# Altium schematic symbol library jlcpcb_2025_04_resistors_extended_1210.schlib: 2670 symbols (part 3 of 14)
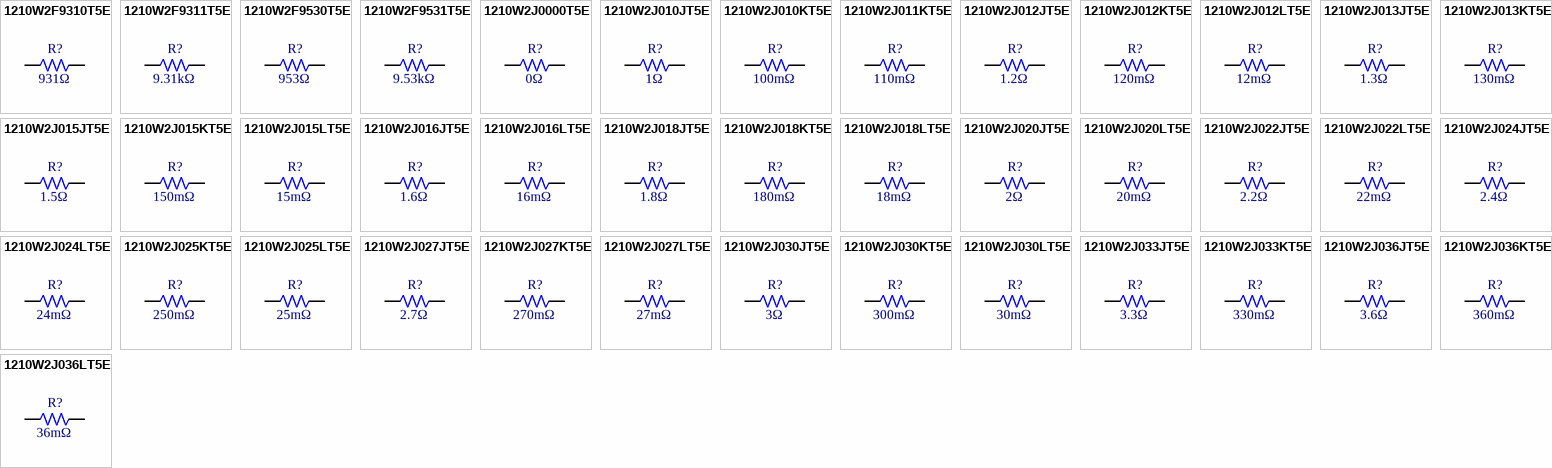
[diagram p68: symbols 1210W2F9310T5E to 1210W2J036LT5E]

## 1210W2J025LT5E
designator R?  Resistance: 25mΩ  (hidden comment: *)
Resistor, 25mΩ, ±5%, 500mW, 200V, ±800ppm/℃, -55℃~+155℃, SMD 1210; Manufacturer: Uniroyal; Manufacturer Part Number: 1210W2J025LT5E; Supplier 1: LCSC; Supplier Part Number 1: C620974; JLCPCB Part Number: C620974; Power Rating: 500mW; Category: Resistors; Package Size: 1210; JLCPCB Basic Part: Yes; Tolerance: ±5%; Voltage Rating: 200V; Temperature Coefficient: ±800ppm/℃; Temperature Rating: -55℃~+155℃; ComponentLink1Description: Datasheet; ComponentLink1URL: https://wmsc.lcsc.com/wmsc/upload/file/pdf/v2/lcsc/2205311816_UNI-ROYAL-Uniroyal-Elec-1210W2J025LT5E_C620974.pdf; ComponentLink2Description: JLCPCB Part URL; ComponentLink2URL: https://jlcpcb.com/partdetail/C620974
pins: 1, 2
1 alternate drawing of the same symbol

## 1210W2J027JT5E
designator R?  Resistance: 2.7Ω  (hidden comment: *)
Resistor, 2.7Ω, ±5%, 500mW, 200V, ±400ppm/℃, -55℃~+155℃, SMD 1210; Manufacturer: Uniroyal; Manufacturer Part Number: 1210W2J027JT5E; Supplier 1: LCSC; Supplier Part Number 1: C621014; JLCPCB Part Number: C621014; Power Rating: 500mW; Category: Resistors; Package Size: 1210; JLCPCB Basic Part: Yes; Tolerance: ±5%; Voltage Rating: 200V; Temperature Coefficient: ±400ppm/℃; Temperature Rating: -55℃~+155℃; ComponentLink1Description: Datasheet; ComponentLink1URL: https://wmsc.lcsc.com/wmsc/upload/file/pdf/v2/lcsc/2205311830_UNI-ROYAL-Uniroyal-Elec-1210W2J027JT5E_C621014.pdf; ComponentLink2Description: JLCPCB Part URL; ComponentLink2URL: https://jlcpcb.com/partdetail/C621014
pins: 1, 2
1 alternate drawing of the same symbol

## 1210W2J027KT5E
designator R?  Resistance: 270mΩ  (hidden comment: *)
Resistor, 270mΩ, ±5%, 500mW, 200V, ±800ppm/℃, -55℃~+155℃, SMD 1210; Manufacturer: Uniroyal; Manufacturer Part Number: 1210W2J027KT5E; Supplier 1: LCSC; Supplier Part Number 1: C620979; JLCPCB Part Number: C620979; Power Rating: 500mW; Category: Resistors; Package Size: 1210; JLCPCB Basic Part: Yes; Tolerance: ±5%; Voltage Rating: 200V; Temperature Coefficient: ±800ppm/℃; Temperature Rating: -55℃~+155℃; ComponentLink1Description: Datasheet; ComponentLink1URL: https://wmsc.lcsc.com/wmsc/upload/file/pdf/v2/lcsc/2205311830_UNI-ROYAL-Uniroyal-Elec-1210W2J027KT5E_C620979.pdf; ComponentLink2Description: JLCPCB Part URL; ComponentLink2URL: https://jlcpcb.com/partdetail/C620979
pins: 1, 2
1 alternate drawing of the same symbol

## 1210W2J027LT5E
designator R?  Resistance: 27mΩ  (hidden comment: *)
Resistor, 27mΩ, ±5%, 500mW, 200V, ±1000ppm/℃, -55℃~+155℃, SMD 1210; Manufacturer: Uniroyal; Manufacturer Part Number: 1210W2J027LT5E; Supplier 1: LCSC; Supplier Part Number 1: C784313; JLCPCB Part Number: C784313; Power Rating: 500mW; Category: Resistors; Package Size: 1210; JLCPCB Basic Part: Yes; Tolerance: ±5%; Voltage Rating: 200V; Temperature Coefficient: ±1000ppm/℃; Temperature Rating: -55℃~+155℃; ComponentLink1Description: Datasheet; ComponentLink1URL: https://wmsc.lcsc.com/wmsc/upload/file/pdf/v2/lcsc/2206011045_UNI-ROYAL-Uniroyal-Elec-1210W2J027LT5E_C784313.pdf; ComponentLink2Description: JLCPCB Part URL; ComponentLink2URL: https://jlcpcb.com/partdetail/C784313
pins: 1, 2
1 alternate drawing of the same symbol

## 1210W2J030JT5E
designator R?  Resistance: 3Ω  (hidden comment: *)
Resistor, 3Ω, ±5%, 500mW, 200V, ±400ppm/℃, -55℃~+155℃, SMD 1210; Manufacturer: Uniroyal; Manufacturer Part Number: 1210W2J030JT5E; Supplier 1: LCSC; Supplier Part Number 1: C270886; JLCPCB Part Number: C270886; Power Rating: 500mW; Category: Resistors; Package Size: 1210; JLCPCB Basic Part: Yes; Tolerance: ±5%; Voltage Rating: 200V; Temperature Coefficient: ±400ppm/℃; Temperature Rating: -55℃~+155℃; ComponentLink1Description: Datasheet; ComponentLink1URL: https://wmsc.lcsc.com/wmsc/upload/file/pdf/v2/lcsc/2205312300_UNI-ROYAL-Uniroyal-Elec-1210W2J030JT5E_C270886.pdf; ComponentLink2Description: JLCPCB Part URL; ComponentLink2URL: https://jlcpcb.com/partdetail/C270886
pins: 1, 2
1 alternate drawing of the same symbol

## 1210W2J030KT5E
designator R?  Resistance: 300mΩ  (hidden comment: *)
Resistor, 300mΩ, ±5%, 500mW, 200V, ±800ppm/℃, -55℃~+155℃, SMD 1210; Manufacturer: Uniroyal; Manufacturer Part Number: 1210W2J030KT5E; Supplier 1: LCSC; Supplier Part Number 1: C55827; JLCPCB Part Number: C55827; Power Rating: 500mW; Category: Resistors; Package Size: 1210; JLCPCB Basic Part: Yes; Tolerance: ±5%; Voltage Rating: 200V; Temperature Coefficient: ±800ppm/℃; Temperature Rating: -55℃~+155℃; ComponentLink1Description: Datasheet; ComponentLink1URL: https://wmsc.lcsc.com/wmsc/upload/file/pdf/v2/lcsc/2205312345_UNI-ROYAL-Uniroyal-Elec-1210W2J030KT5E_C55827.pdf; ComponentLink2Description: JLCPCB Part URL; ComponentLink2URL: https://jlcpcb.com/partdetail/C55827
pins: 1, 2
1 alternate drawing of the same symbol

## 1210W2J030LT5E
designator R?  Resistance: 30mΩ  (hidden comment: *)
Resistor, 30mΩ, ±5%, 500mW, 200V, ±800ppm/℃, -55℃~+155℃, SMD 1210; Manufacturer: Uniroyal; Manufacturer Part Number: 1210W2J030LT5E; Supplier 1: LCSC; Supplier Part Number 1: C407151; JLCPCB Part Number: C407151; Power Rating: 500mW; Category: Resistors; Package Size: 1210; JLCPCB Basic Part: Yes; Tolerance: ±5%; Voltage Rating: 200V; Temperature Coefficient: ±800ppm/℃; Temperature Rating: -55℃~+155℃; ComponentLink1Description: Datasheet; ComponentLink1URL: https://wmsc.lcsc.com/wmsc/upload/file/pdf/v2/lcsc/2205312300_UNI-ROYAL-Uniroyal-Elec-1210W2J030LT5E_C407151.pdf; ComponentLink2Description: JLCPCB Part URL; ComponentLink2URL: https://jlcpcb.com/partdetail/C407151
pins: 1, 2
1 alternate drawing of the same symbol

## 1210W2J033JT5E
designator R?  Resistance: 3.3Ω  (hidden comment: *)
Resistor, 3.3Ω, ±5%, 500mW, 200V, ±200ppm/℃, -55℃~+155℃, SMD 1210; Manufacturer: Uniroyal; Manufacturer Part Number: 1210W2J033JT5E; Supplier 1: LCSC; Supplier Part Number 1: C474145; JLCPCB Part Number: C474145; Power Rating: 500mW; Category: Resistors; Package Size: 1210; JLCPCB Basic Part: Yes; Tolerance: ±5%; Voltage Rating: 200V; Temperature Coefficient: ±200ppm/℃; Temperature Rating: -55℃~+155℃; ComponentLink1Description: Datasheet; ComponentLink1URL: https://wmsc.lcsc.com/wmsc/upload/file/pdf/v2/lcsc/2206011100_UNI-ROYAL-Uniroyal-Elec-1210W2J033JT5E_C474145.pdf; ComponentLink2Description: JLCPCB Part URL; ComponentLink2URL: https://jlcpcb.com/partdetail/C474145
pins: 1, 2
1 alternate drawing of the same symbol

## 1210W2J033KT5E
designator R?  Resistance: 330mΩ  (hidden comment: *)
Resistor, 330mΩ, ±5%, 500mW, 200V, ±800ppm/℃, -55℃~+155℃, SMD 1210; Manufacturer: Uniroyal; Manufacturer Part Number: 1210W2J033KT5E; Supplier 1: LCSC; Supplier Part Number 1: C620980; JLCPCB Part Number: C620980; Power Rating: 500mW; Category: Resistors; Package Size: 1210; JLCPCB Basic Part: Yes; Tolerance: ±5%; Voltage Rating: 200V; Temperature Coefficient: ±800ppm/℃; Temperature Rating: -55℃~+155℃; ComponentLink1Description: Datasheet; ComponentLink1URL: https://wmsc.lcsc.com/wmsc/upload/file/pdf/v2/lcsc/2205311830_UNI-ROYAL-Uniroyal-Elec-1210W2J033KT5E_C620980.pdf; ComponentLink2Description: JLCPCB Part URL; ComponentLink2URL: https://jlcpcb.com/partdetail/C620980
pins: 1, 2
1 alternate drawing of the same symbol

## 1210W2J036JT5E
designator R?  Resistance: 3.6Ω  (hidden comment: *)
Resistor, 3.6Ω, ±5%, 500mW, 200V, ±200ppm/℃, -55℃~+155℃, SMD 1210; Manufacturer: Uniroyal; Manufacturer Part Number: 1210W2J036JT5E; Supplier 1: LCSC; Supplier Part Number 1: C621027; JLCPCB Part Number: C621027; Power Rating: 500mW; Category: Resistors; Package Size: 1210; JLCPCB Basic Part: Yes; Tolerance: ±5%; Voltage Rating: 200V; Temperature Coefficient: ±200ppm/℃; Temperature Rating: -55℃~+155℃; ComponentLink1Description: Datasheet; ComponentLink1URL: https://wmsc.lcsc.com/wmsc/upload/file/pdf/v2/lcsc/2205311830_UNI-ROYAL-Uniroyal-Elec-1210W2J036JT5E_C621027.pdf; ComponentLink2Description: JLCPCB Part URL; ComponentLink2URL: https://jlcpcb.com/partdetail/C621027
pins: 1, 2
1 alternate drawing of the same symbol

## 1210W2J036KT5E
designator R?  Resistance: 360mΩ  (hidden comment: *)
Resistor, 360mΩ, ±5%, 500mW, 200V, ±800ppm/℃, -55℃~+155℃, SMD 1210; Manufacturer: Uniroyal; Manufacturer Part Number: 1210W2J036KT5E; Supplier 1: LCSC; Supplier Part Number 1: C422206; JLCPCB Part Number: C422206; Power Rating: 500mW; Category: Resistors; Package Size: 1210; JLCPCB Basic Part: Yes; Tolerance: ±5%; Voltage Rating: 200V; Temperature Coefficient: ±800ppm/℃; Temperature Rating: -55℃~+155℃; ComponentLink1Description: Datasheet; ComponentLink1URL: https://wmsc.lcsc.com/wmsc/upload/file/pdf/v2/lcsc/2205312245_UNI-ROYAL-Uniroyal-Elec-1210W2J036KT5E_C422206.pdf; ComponentLink2Description: JLCPCB Part URL; ComponentLink2URL: https://jlcpcb.com/partdetail/C422206
pins: 1, 2
1 alternate drawing of the same symbol

## 1210W2J036LT5E
designator R?  Resistance: 36mΩ  (hidden comment: *)
Resistor, 36mΩ, ±5%, 500mW, 200V, ±800ppm/℃, -55℃~+155℃, SMD 1210; Manufacturer: Uniroyal; Manufacturer Part Number: 1210W2J036LT5E; Supplier 1: LCSC; Supplier Part Number 1: C422205; JLCPCB Part Number: C422205; Power Rating: 500mW; Category: Resistors; Package Size: 1210; JLCPCB Basic Part: Yes; Tolerance: ±5%; Voltage Rating: 200V; Temperature Coefficient: ±800ppm/℃; Temperature Rating: -55℃~+155℃; ComponentLink1Description: Datasheet; ComponentLink1URL: https://wmsc.lcsc.com/wmsc/upload/file/pdf/v2/lcsc/2205312245_UNI-ROYAL-Uniroyal-Elec-1210W2J036LT5E_C422205.pdf; ComponentLink2Description: JLCPCB Part URL; ComponentLink2URL: https://jlcpcb.com/partdetail/C422205
pins: 1, 2
1 alternate drawing of the same symbol

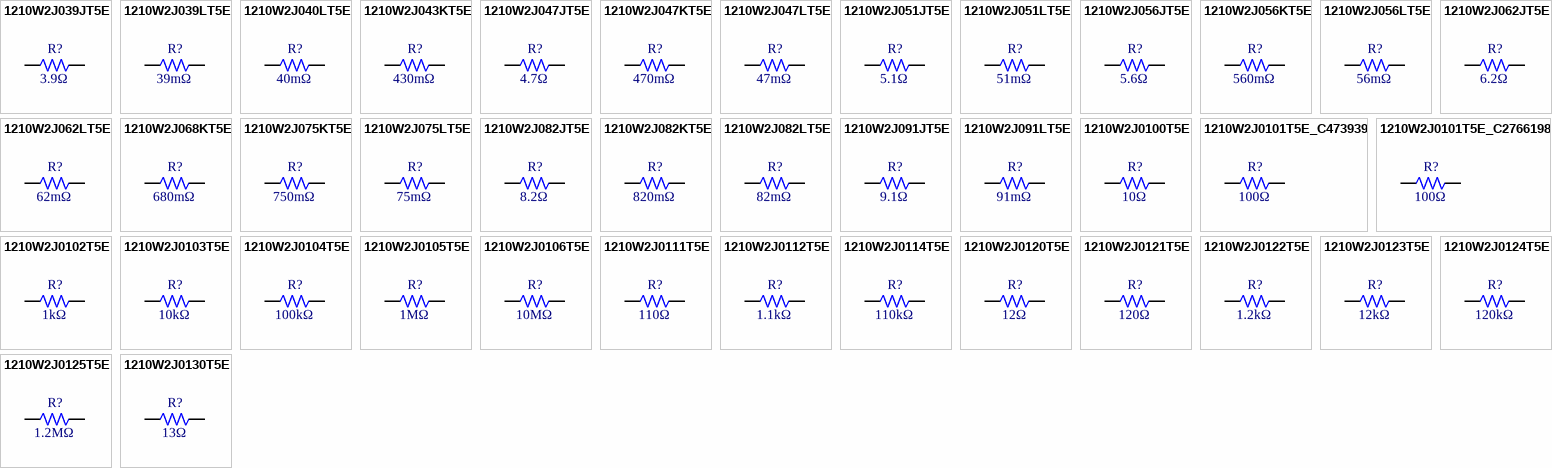
[diagram p10: symbols 1210W2J039JT5E to 1210W2J0130T5E]

## 1210W2J039JT5E
designator R?  Resistance: 3.9Ω  (hidden comment: *)
Resistor, 3.9Ω, ±5%, 500mW, 200V, ±200ppm/℃, -55℃~+155℃, SMD 1210; Manufacturer: Uniroyal; Manufacturer Part Number: 1210W2J039JT5E; Supplier 1: LCSC; Supplier Part Number 1: C621029; JLCPCB Part Number: C621029; Power Rating: 500mW; Category: Resistors; Package Size: 1210; JLCPCB Basic Part: Yes; Tolerance: ±5%; Voltage Rating: 200V; Temperature Coefficient: ±200ppm/℃; Temperature Rating: -55℃~+155℃; ComponentLink1Description: Datasheet; ComponentLink1URL: https://wmsc.lcsc.com/wmsc/upload/file/pdf/v2/lcsc/2205311830_UNI-ROYAL-Uniroyal-Elec-1210W2J039JT5E_C621029.pdf; ComponentLink2Description: JLCPCB Part URL; ComponentLink2URL: https://jlcpcb.com/partdetail/C621029
pins: 1, 2
1 alternate drawing of the same symbol

## 1210W2J039LT5E
designator R?  Resistance: 39mΩ  (hidden comment: *)
Resistor, 39mΩ, ±5%, 500mW, 200V, ±800ppm/℃, -55℃~+155℃, SMD 1210; Manufacturer: Uniroyal; Manufacturer Part Number: 1210W2J039LT5E; Supplier 1: LCSC; Supplier Part Number 1: C422203; JLCPCB Part Number: C422203; Power Rating: 500mW; Category: Resistors; Package Size: 1210; JLCPCB Basic Part: Yes; Tolerance: ±5%; Voltage Rating: 200V; Temperature Coefficient: ±800ppm/℃; Temperature Rating: -55℃~+155℃; ComponentLink1Description: Datasheet; ComponentLink1URL: https://wmsc.lcsc.com/wmsc/upload/file/pdf/v2/lcsc/2205312245_UNI-ROYAL-Uniroyal-Elec-1210W2J039LT5E_C422203.pdf; ComponentLink2Description: JLCPCB Part URL; ComponentLink2URL: https://jlcpcb.com/partdetail/C422203
pins: 1, 2
1 alternate drawing of the same symbol

## 1210W2J040LT5E
designator R?  Resistance: 40mΩ  (hidden comment: *)
Resistor, 40mΩ, ±5%, 500mW, 200V, ±800ppm/℃, -55℃~+155℃, SMD 1210; Manufacturer: Uniroyal; Manufacturer Part Number: 1210W2J040LT5E; Supplier 1: LCSC; Supplier Part Number 1: C422202; JLCPCB Part Number: C422202; Power Rating: 500mW; Category: Resistors; Package Size: 1210; JLCPCB Basic Part: Yes; Tolerance: ±5%; Voltage Rating: 200V; Temperature Coefficient: ±800ppm/℃; Temperature Rating: -55℃~+155℃; ComponentLink1Description: Datasheet; ComponentLink1URL: https://wmsc.lcsc.com/wmsc/upload/file/pdf/v2/lcsc/2205312245_UNI-ROYAL-Uniroyal-Elec-1210W2J040LT5E_C422202.pdf; ComponentLink2Description: JLCPCB Part URL; ComponentLink2URL: https://jlcpcb.com/partdetail/C422202
pins: 1, 2
1 alternate drawing of the same symbol

## 1210W2J043KT5E
designator R?  Resistance: 430mΩ  (hidden comment: *)
Resistor, 430mΩ, ±5%, 500mW, 200V, ±800ppm/℃, -55℃~+155℃, SMD 1210; Manufacturer: Uniroyal; Manufacturer Part Number: 1210W2J043KT5E; Supplier 1: LCSC; Supplier Part Number 1: C422200; JLCPCB Part Number: C422200; Power Rating: 500mW; Category: Resistors; Package Size: 1210; JLCPCB Basic Part: Yes; Tolerance: ±5%; Voltage Rating: 200V; Temperature Coefficient: ±800ppm/℃; Temperature Rating: -55℃~+155℃; ComponentLink1Description: Datasheet; ComponentLink1URL: https://wmsc.lcsc.com/wmsc/upload/file/pdf/v2/lcsc/2205312245_UNI-ROYAL-Uniroyal-Elec-1210W2J043KT5E_C422200.pdf; ComponentLink2Description: JLCPCB Part URL; ComponentLink2URL: https://jlcpcb.com/partdetail/C422200
pins: 1, 2
1 alternate drawing of the same symbol

## 1210W2J047JT5E
designator R?  Resistance: 4.7Ω  (hidden comment: *)
Resistor, 4.7Ω, ±5%, 500mW, 200V, ±200ppm/℃, -55℃~+155℃, SMD 1210; Manufacturer: Uniroyal; Manufacturer Part Number: 1210W2J047JT5E; Supplier 1: LCSC; Supplier Part Number 1: C10996; JLCPCB Part Number: C10996; Power Rating: 500mW; Category: Resistors; Package Size: 1210; JLCPCB Basic Part: Yes; Tolerance: ±5%; Voltage Rating: 200V; Temperature Coefficient: ±200ppm/℃; Temperature Rating: -55℃~+155℃; ComponentLink1Description: Datasheet; ComponentLink1URL: https://wmsc.lcsc.com/wmsc/upload/file/pdf/v2/lcsc/2206010216_UNI-ROYAL-Uniroyal-Elec-1210W2J047JT5E_C10996.pdf; ComponentLink2Description: JLCPCB Part URL; ComponentLink2URL: https://jlcpcb.com/partdetail/C10996
pins: 1, 2
1 alternate drawing of the same symbol

## 1210W2J047KT5E
designator R?  Resistance: 470mΩ  (hidden comment: *)
Resistor, 470mΩ, ±5%, 500mW, 200V, ±800ppm/℃, -55℃~+155℃, SMD 1210; Manufacturer: Uniroyal; Manufacturer Part Number: 1210W2J047KT5E; Supplier 1: LCSC; Supplier Part Number 1: C474225; JLCPCB Part Number: C474225; Power Rating: 500mW; Category: Resistors; Package Size: 1210; JLCPCB Basic Part: Yes; Tolerance: ±5%; Voltage Rating: 200V; Temperature Coefficient: ±800ppm/℃; Temperature Rating: -55℃~+155℃; ComponentLink1Description: Datasheet; ComponentLink1URL: https://wmsc.lcsc.com/wmsc/upload/file/pdf/v2/lcsc/2206011100_UNI-ROYAL-Uniroyal-Elec-1210W2J047KT5E_C474225.pdf; ComponentLink2Description: JLCPCB Part URL; ComponentLink2URL: https://jlcpcb.com/partdetail/C474225
pins: 1, 2
1 alternate drawing of the same symbol

## 1210W2J047LT5E
designator R?  Resistance: 47mΩ  (hidden comment: *)
Resistor, 47mΩ, ±5%, 500mW, 200V, ±800ppm/℃, -55℃~+155℃, SMD 1210; Manufacturer: Uniroyal; Manufacturer Part Number: 1210W2J047LT5E; Supplier 1: LCSC; Supplier Part Number 1: C422197; JLCPCB Part Number: C422197; Power Rating: 500mW; Category: Resistors; Package Size: 1210; JLCPCB Basic Part: Yes; Tolerance: ±5%; Voltage Rating: 200V; Temperature Coefficient: ±800ppm/℃; Temperature Rating: -55℃~+155℃; ComponentLink1Description: Datasheet; ComponentLink1URL: https://wmsc.lcsc.com/wmsc/upload/file/pdf/v2/lcsc/2205312245_UNI-ROYAL-Uniroyal-Elec-1210W2J047LT5E_C422197.pdf; ComponentLink2Description: JLCPCB Part URL; ComponentLink2URL: https://jlcpcb.com/partdetail/C422197
pins: 1, 2
1 alternate drawing of the same symbol

## 1210W2J051JT5E
designator R?  Resistance: 5.1Ω  (hidden comment: *)
Resistor, 5.1Ω, ±5%, 500mW, 200V, ±200ppm/℃, -55℃~+155℃, SMD 1210; Manufacturer: Uniroyal; Manufacturer Part Number: 1210W2J051JT5E; Supplier 1: LCSC; Supplier Part Number 1: C621049; JLCPCB Part Number: C621049; Power Rating: 500mW; Category: Resistors; Package Size: 1210; JLCPCB Basic Part: Yes; Tolerance: ±5%; Voltage Rating: 200V; Temperature Coefficient: ±200ppm/℃; Temperature Rating: -55℃~+155℃; ComponentLink1Description: Datasheet; ComponentLink1URL: https://wmsc.lcsc.com/wmsc/upload/file/pdf/v2/lcsc/2205311830_UNI-ROYAL-Uniroyal-Elec-1210W2J051JT5E_C621049.pdf; ComponentLink2Description: JLCPCB Part URL; ComponentLink2URL: https://jlcpcb.com/partdetail/C621049
pins: 1, 2
1 alternate drawing of the same symbol

## 1210W2J051LT5E
designator R?  Resistance: 51mΩ  (hidden comment: *)
Resistor, 51mΩ, ±5%, 500mW, 200V, ±800ppm/℃, -55℃~+155℃, SMD 1210; Manufacturer: Uniroyal; Manufacturer Part Number: 1210W2J051LT5E; Supplier 1: LCSC; Supplier Part Number 1: C407148; JLCPCB Part Number: C407148; Power Rating: 500mW; Category: Resistors; Package Size: 1210; JLCPCB Basic Part: Yes; Tolerance: ±5%; Voltage Rating: 200V; Temperature Coefficient: ±800ppm/℃; Temperature Rating: -55℃~+155℃; ComponentLink1Description: Datasheet; ComponentLink1URL: https://wmsc.lcsc.com/wmsc/upload/file/pdf/v2/lcsc/2205312300_UNI-ROYAL-Uniroyal-Elec-1210W2J051LT5E_C407148.pdf; ComponentLink2Description: JLCPCB Part URL; ComponentLink2URL: https://jlcpcb.com/partdetail/C407148
pins: 1, 2
1 alternate drawing of the same symbol

## 1210W2J056JT5E
designator R?  Resistance: 5.6Ω  (hidden comment: *)
Resistor, 5.6Ω, ±5%, 500mW, 200V, ±200ppm/℃, -55℃~+155℃, SMD 1210; Manufacturer: Uniroyal; Manufacturer Part Number: 1210W2J056JT5E; Supplier 1: LCSC; Supplier Part Number 1: C621050; JLCPCB Part Number: C621050; Power Rating: 500mW; Category: Resistors; Package Size: 1210; JLCPCB Basic Part: Yes; Tolerance: ±5%; Voltage Rating: 200V; Temperature Coefficient: ±200ppm/℃; Temperature Rating: -55℃~+155℃; ComponentLink1Description: Datasheet; ComponentLink1URL: https://wmsc.lcsc.com/wmsc/upload/file/pdf/v2/lcsc/2205311830_UNI-ROYAL-Uniroyal-Elec-1210W2J056JT5E_C621050.pdf; ComponentLink2Description: JLCPCB Part URL; ComponentLink2URL: https://jlcpcb.com/partdetail/C621050
pins: 1, 2
1 alternate drawing of the same symbol

## 1210W2J056KT5E
designator R?  Resistance: 560mΩ  (hidden comment: *)
Resistor, 560mΩ, ±5%, 500mW, 200V, ±800ppm/℃, -55℃~+155℃, SMD 1210; Manufacturer: Uniroyal; Manufacturer Part Number: 1210W2J056KT5E; Supplier 1: LCSC; Supplier Part Number 1: C620984; JLCPCB Part Number: C620984; Power Rating: 500mW; Category: Resistors; Package Size: 1210; JLCPCB Basic Part: Yes; Tolerance: ±5%; Voltage Rating: 200V; Temperature Coefficient: ±800ppm/℃; Temperature Rating: -55℃~+155℃; ComponentLink1Description: Datasheet; ComponentLink1URL: https://wmsc.lcsc.com/wmsc/upload/file/pdf/v2/lcsc/2205311830_UNI-ROYAL-Uniroyal-Elec-1210W2J056KT5E_C620984.pdf; ComponentLink2Description: JLCPCB Part URL; ComponentLink2URL: https://jlcpcb.com/partdetail/C620984
pins: 1, 2
1 alternate drawing of the same symbol

## 1210W2J056LT5E
designator R?  Resistance: 56mΩ  (hidden comment: *)
Resistor, 56mΩ, ±5%, 500mW, 200V, ±800ppm/℃, -55℃~+155℃, SMD 1210; Manufacturer: Uniroyal; Manufacturer Part Number: 1210W2J056LT5E; Supplier 1: LCSC; Supplier Part Number 1: C784316; JLCPCB Part Number: C784316; Power Rating: 500mW; Category: Resistors; Package Size: 1210; JLCPCB Basic Part: Yes; Tolerance: ±5%; Voltage Rating: 200V; Temperature Coefficient: ±800ppm/℃; Temperature Rating: -55℃~+155℃; ComponentLink1Description: Datasheet; ComponentLink1URL: https://wmsc.lcsc.com/wmsc/upload/file/pdf/v2/lcsc/2206011045_UNI-ROYAL-Uniroyal-Elec-1210W2J056LT5E_C784316.pdf; ComponentLink2Description: JLCPCB Part URL; ComponentLink2URL: https://jlcpcb.com/partdetail/C784316
pins: 1, 2
1 alternate drawing of the same symbol

## 1210W2J062JT5E
designator R?  Resistance: 6.2Ω  (hidden comment: *)
Resistor, 6.2Ω, ±5%, 500mW, 200V, ±200ppm/℃, -55℃~+155℃, SMD 1210; Manufacturer: Uniroyal; Manufacturer Part Number: 1210W2J062JT5E; Supplier 1: LCSC; Supplier Part Number 1: C621055; JLCPCB Part Number: C621055; Power Rating: 500mW; Category: Resistors; Package Size: 1210; JLCPCB Basic Part: Yes; Tolerance: ±5%; Voltage Rating: 200V; Temperature Coefficient: ±200ppm/℃; Temperature Rating: -55℃~+155℃; ComponentLink1Description: Datasheet; ComponentLink1URL: https://wmsc.lcsc.com/wmsc/upload/file/pdf/v2/lcsc/2205311830_UNI-ROYAL-Uniroyal-Elec-1210W2J062JT5E_C621055.pdf; ComponentLink2Description: JLCPCB Part URL; ComponentLink2URL: https://jlcpcb.com/partdetail/C621055
pins: 1, 2
1 alternate drawing of the same symbol

## 1210W2J062LT5E
designator R?  Resistance: 62mΩ  (hidden comment: *)
Resistor, 62mΩ, ±5%, 500mW, 200V, ±800ppm/℃, -55℃~+155℃, SMD 1210; Manufacturer: Uniroyal; Manufacturer Part Number: 1210W2J062LT5E; Supplier 1: LCSC; Supplier Part Number 1: C422196; JLCPCB Part Number: C422196; Power Rating: 500mW; Category: Resistors; Package Size: 1210; JLCPCB Basic Part: Yes; Tolerance: ±5%; Voltage Rating: 200V; Temperature Coefficient: ±800ppm/℃; Temperature Rating: -55℃~+155℃; ComponentLink1Description: Datasheet; ComponentLink1URL: https://wmsc.lcsc.com/wmsc/upload/file/pdf/v2/lcsc/2205312245_UNI-ROYAL-Uniroyal-Elec-1210W2J062LT5E_C422196.pdf; ComponentLink2Description: JLCPCB Part URL; ComponentLink2URL: https://jlcpcb.com/partdetail/C422196
pins: 1, 2
1 alternate drawing of the same symbol

## 1210W2J068KT5E
designator R?  Resistance: 680mΩ  (hidden comment: *)
Resistor, 680mΩ, ±5%, 500mW, 200V, ±800ppm/℃, -55℃~+155℃, SMD 1210; Manufacturer: Uniroyal; Manufacturer Part Number: 1210W2J068KT5E; Supplier 1: LCSC; Supplier Part Number 1: C620987; JLCPCB Part Number: C620987; Power Rating: 500mW; Category: Resistors; Package Size: 1210; JLCPCB Basic Part: Yes; Tolerance: ±5%; Voltage Rating: 200V; Temperature Coefficient: ±800ppm/℃; Temperature Rating: -55℃~+155℃; ComponentLink1Description: Datasheet; ComponentLink1URL: https://wmsc.lcsc.com/wmsc/upload/file/pdf/v2/lcsc/2205311830_UNI-ROYAL-Uniroyal-Elec-1210W2J068KT5E_C620987.pdf; ComponentLink2Description: JLCPCB Part URL; ComponentLink2URL: https://jlcpcb.com/partdetail/C620987
pins: 1, 2
1 alternate drawing of the same symbol

## 1210W2J075KT5E
designator R?  Resistance: 750mΩ  (hidden comment: *)
Resistor, 750mΩ, ±5%, 500mW, 200V, ±800ppm/℃, -55℃~+155℃, SMD 1210; Manufacturer: Uniroyal; Manufacturer Part Number: 1210W2J075KT5E; Supplier 1: LCSC; Supplier Part Number 1: C422193; JLCPCB Part Number: C422193; Power Rating: 500mW; Category: Resistors; Package Size: 1210; JLCPCB Basic Part: Yes; Tolerance: ±5%; Voltage Rating: 200V; Temperature Coefficient: ±800ppm/℃; Temperature Rating: -55℃~+155℃; ComponentLink1Description: Datasheet; ComponentLink1URL: https://wmsc.lcsc.com/wmsc/upload/file/pdf/v2/lcsc/2205312245_UNI-ROYAL-Uniroyal-Elec-1210W2J075KT5E_C422193.pdf; ComponentLink2Description: JLCPCB Part URL; ComponentLink2URL: https://jlcpcb.com/partdetail/C422193
pins: 1, 2
1 alternate drawing of the same symbol

## 1210W2J075LT5E
designator R?  Resistance: 75mΩ  (hidden comment: *)
Resistor, 75mΩ, ±5%, 500mW, 200V, ±800ppm/℃, -55℃~+155℃, SMD 1210; Manufacturer: Uniroyal; Manufacturer Part Number: 1210W2J075LT5E; Supplier 1: LCSC; Supplier Part Number 1: C422192; JLCPCB Part Number: C422192; Power Rating: 500mW; Category: Resistors; Package Size: 1210; JLCPCB Basic Part: Yes; Tolerance: ±5%; Voltage Rating: 200V; Temperature Coefficient: ±800ppm/℃; Temperature Rating: -55℃~+155℃; ComponentLink1Description: Datasheet; ComponentLink1URL: https://wmsc.lcsc.com/wmsc/upload/file/pdf/v2/lcsc/2205312245_UNI-ROYAL-Uniroyal-Elec-1210W2J075LT5E_C422192.pdf; ComponentLink2Description: JLCPCB Part URL; ComponentLink2URL: https://jlcpcb.com/partdetail/C422192
pins: 1, 2
1 alternate drawing of the same symbol

## 1210W2J082JT5E
designator R?  Resistance: 8.2Ω  (hidden comment: *)
Resistor, 8.2Ω, ±5%, 500mW, 200V, ±200ppm/℃, -55℃~+155℃, SMD 1210; Manufacturer: Uniroyal; Manufacturer Part Number: 1210W2J082JT5E; Supplier 1: LCSC; Supplier Part Number 1: C621066; JLCPCB Part Number: C621066; Power Rating: 500mW; Category: Resistors; Package Size: 1210; JLCPCB Basic Part: Yes; Tolerance: ±5%; Voltage Rating: 200V; Temperature Coefficient: ±200ppm/℃; Temperature Rating: -55℃~+155℃; ComponentLink1Description: Datasheet; ComponentLink1URL: https://wmsc.lcsc.com/wmsc/upload/file/pdf/v2/lcsc/2205311830_UNI-ROYAL-Uniroyal-Elec-1210W2J082JT5E_C621066.pdf; ComponentLink2Description: JLCPCB Part URL; ComponentLink2URL: https://jlcpcb.com/partdetail/C621066
pins: 1, 2
1 alternate drawing of the same symbol

## 1210W2J082KT5E
designator R?  Resistance: 820mΩ  (hidden comment: *)
Resistor, 820mΩ, ±5%, 500mW, 200V, ±800ppm/℃, -55℃~+155℃, SMD 1210; Manufacturer: Uniroyal; Manufacturer Part Number: 1210W2J082KT5E; Supplier 1: LCSC; Supplier Part Number 1: C65414; JLCPCB Part Number: C65414; Power Rating: 500mW; Category: Resistors; Package Size: 1210; JLCPCB Basic Part: Yes; Tolerance: ±5%; Voltage Rating: 200V; Temperature Coefficient: ±800ppm/℃; Temperature Rating: -55℃~+155℃; ComponentLink1Description: Datasheet; ComponentLink1URL: https://wmsc.lcsc.com/wmsc/upload/file/pdf/v2/lcsc/2205312345_UNI-ROYAL-Uniroyal-Elec-1210W2J082KT5E_C65414.pdf; ComponentLink2Description: JLCPCB Part URL; ComponentLink2URL: https://jlcpcb.com/partdetail/C65414
pins: 1, 2
1 alternate drawing of the same symbol

## 1210W2J082LT5E
designator R?  Resistance: 82mΩ  (hidden comment: *)
Resistor, 82mΩ, ±5%, 500mW, 200V, ±800ppm/℃, -55℃~+155℃, SMD 1210; Manufacturer: Uniroyal; Manufacturer Part Number: 1210W2J082LT5E; Supplier 1: LCSC; Supplier Part Number 1: C784319; JLCPCB Part Number: C784319; Power Rating: 500mW; Category: Resistors; Package Size: 1210; JLCPCB Basic Part: Yes; Tolerance: ±5%; Voltage Rating: 200V; Temperature Coefficient: ±800ppm/℃; Temperature Rating: -55℃~+155℃; ComponentLink1Description: Datasheet; ComponentLink1URL: https://wmsc.lcsc.com/wmsc/upload/file/pdf/v2/lcsc/2206011045_UNI-ROYAL-Uniroyal-Elec-1210W2J082LT5E_C784319.pdf; ComponentLink2Description: JLCPCB Part URL; ComponentLink2URL: https://jlcpcb.com/partdetail/C784319
pins: 1, 2
1 alternate drawing of the same symbol

## 1210W2J091JT5E
designator R?  Resistance: 9.1Ω  (hidden comment: *)
Resistor, 9.1Ω, ±5%, 500mW, 200V, ±400ppm/℃, -55℃~+155℃, SMD 1210; Manufacturer: Uniroyal; Manufacturer Part Number: 1210W2J091JT5E; Supplier 1: LCSC; Supplier Part Number 1: C422190; JLCPCB Part Number: C422190; Power Rating: 500mW; Category: Resistors; Package Size: 1210; JLCPCB Basic Part: Yes; Tolerance: ±5%; Voltage Rating: 200V; Temperature Coefficient: ±400ppm/℃; Temperature Rating: -55℃~+155℃; ComponentLink1Description: Datasheet; ComponentLink1URL: https://wmsc.lcsc.com/wmsc/upload/file/pdf/v2/lcsc/2205312245_UNI-ROYAL-Uniroyal-Elec-1210W2J091JT5E_C422190.pdf; ComponentLink2Description: JLCPCB Part URL; ComponentLink2URL: https://jlcpcb.com/partdetail/C422190
pins: 1, 2
1 alternate drawing of the same symbol

## 1210W2J091LT5E
designator R?  Resistance: 91mΩ  (hidden comment: *)
Resistor, 91mΩ, ±5%, 500mW, 200V, ±800ppm/℃, -55℃~+155℃, SMD 1210; Manufacturer: Uniroyal; Manufacturer Part Number: 1210W2J091LT5E; Supplier 1: LCSC; Supplier Part Number 1: C422189; JLCPCB Part Number: C422189; Power Rating: 500mW; Category: Resistors; Package Size: 1210; JLCPCB Basic Part: Yes; Tolerance: ±5%; Voltage Rating: 200V; Temperature Coefficient: ±800ppm/℃; Temperature Rating: -55℃~+155℃; ComponentLink1Description: Datasheet; ComponentLink1URL: https://wmsc.lcsc.com/wmsc/upload/file/pdf/v2/lcsc/2205312245_UNI-ROYAL-Uniroyal-Elec-1210W2J091LT5E_C422189.pdf; ComponentLink2Description: JLCPCB Part URL; ComponentLink2URL: https://jlcpcb.com/partdetail/C422189
pins: 1, 2
1 alternate drawing of the same symbol

## 1210W2J0100T5E
designator R?  Resistance: 10Ω  (hidden comment: *)
Resistor, 10Ω, ±5%, 500mW, 200V, ±200ppm/℃, -55℃~+155℃, SMD 1210; Manufacturer: Uniroyal; Manufacturer Part Number: 1210W2J0100T5E; Supplier 1: LCSC; Supplier Part Number 1: C473562; JLCPCB Part Number: C473562; Power Rating: 500mW; Category: Resistors; Package Size: 1210; JLCPCB Basic Part: Yes; Tolerance: ±5%; Voltage Rating: 200V; Temperature Coefficient: ±200ppm/℃; Temperature Rating: -55℃~+155℃; ComponentLink1Description: Datasheet; ComponentLink1URL: https://wmsc.lcsc.com/wmsc/upload/file/pdf/v2/lcsc/2206011100_UNI-ROYAL-Uniroyal-Elec-1210W2J0100T5E_C473562.pdf; ComponentLink2Description: JLCPCB Part URL; ComponentLink2URL: https://jlcpcb.com/partdetail/C473562
pins: 1, 2
1 alternate drawing of the same symbol

## 1210W2J0101T5E_C473939
designator R?  Resistance: 100Ω  (hidden comment: *)
Resistor, 100Ω, ±5%, 500mW, 200V, ±100ppm/℃, -55℃~+155℃, SMD 1210; Manufacturer: Uniroyal; Manufacturer Part Number: 1210W2J0101T5E; Supplier 1: LCSC; Supplier Part Number 1: C473939; JLCPCB Part Number: C473939; Power Rating: 500mW; Category: Resistors; Package Size: 1210; JLCPCB Basic Part: Yes; Tolerance: ±5%; Voltage Rating: 200V; Temperature Coefficient: ±100ppm/℃; Temperature Rating: -55℃~+155℃; ComponentLink1Description: Datasheet; ComponentLink1URL: https://wmsc.lcsc.com/wmsc/upload/file/pdf/v2/lcsc/2206011100_UNI-ROYAL-Uniroyal-Elec-1210W2J0101T5E_C473939.pdf; ComponentLink2Description: JLCPCB Part URL; ComponentLink2URL: https://jlcpcb.com/partdetail/C473939
pins: 1, 2
1 alternate drawing of the same symbol

## 1210W2J0101T5E_C2766198
designator R?  Resistance: 100Ω  (hidden comment: *)
Resistor, 100Ω, ±5%, 500mW, 200V, ±100ppm/℃, -55℃~+155℃, SMD 1210; Manufacturer: Uniroyal; Manufacturer Part Number: 1210W2J0101T5E; Supplier 1: LCSC; Supplier Part Number 1: C2766198; JLCPCB Part Number: C2766198; Power Rating: 500mW; Category: Resistors; Package Size: 1210; JLCPCB Basic Part: Yes; Tolerance: ±5%; Voltage Rating: 200V; Temperature Coefficient: ±100ppm/℃; Temperature Rating: -55℃~+155℃; ComponentLink1Description: Datasheet; ComponentLink1URL: https://wmsc.lcsc.com/wmsc/upload/file/pdf/v2/lcsc/2206011045_UNI-ROYAL-Uniroyal-Elec-1210W2J0101T5E_C2766198.pdf; ComponentLink2Description: JLCPCB Part URL; ComponentLink2URL: https://jlcpcb.com/partdetail/C2766198
pins: 1, 2
1 alternate drawing of the same symbol

## 1210W2J0102T5E
designator R?  Resistance: 1kΩ  (hidden comment: *)
Resistor, 1kΩ, ±5%, 500mW, 200V, ±100ppm/℃, -55℃~+155℃, SMD 1210; Manufacturer: Uniroyal; Manufacturer Part Number: 1210W2J0102T5E; Supplier 1: LCSC; Supplier Part Number 1: C270888; JLCPCB Part Number: C270888; Power Rating: 500mW; Category: Resistors; Package Size: 1210; JLCPCB Basic Part: Yes; Tolerance: ±5%; Voltage Rating: 200V; Temperature Coefficient: ±100ppm/℃; Temperature Rating: -55℃~+155℃; ComponentLink1Description: Datasheet; ComponentLink1URL: https://wmsc.lcsc.com/wmsc/upload/file/pdf/v2/lcsc/2205312300_UNI-ROYAL-Uniroyal-Elec-1210W2J0102T5E_C270888.pdf; ComponentLink2Description: JLCPCB Part URL; ComponentLink2URL: https://jlcpcb.com/partdetail/C270888
pins: 1, 2
1 alternate drawing of the same symbol

## 1210W2J0103T5E
designator R?  Resistance: 10kΩ  (hidden comment: *)
Resistor, 10kΩ, ±5%, 500mW, 200V, ±100ppm/℃, -55℃~+155℃, SMD 1210; Manufacturer: Uniroyal; Manufacturer Part Number: 1210W2J0103T5E; Supplier 1: LCSC; Supplier Part Number 1: C474295; JLCPCB Part Number: C474295; Power Rating: 500mW; Category: Resistors; Package Size: 1210; JLCPCB Basic Part: Yes; Tolerance: ±5%; Voltage Rating: 200V; Temperature Coefficient: ±100ppm/℃; Temperature Rating: -55℃~+155℃; ComponentLink1Description: Datasheet; ComponentLink1URL: https://wmsc.lcsc.com/wmsc/upload/file/pdf/v2/lcsc/2206011100_UNI-ROYAL-Uniroyal-Elec-1210W2J0103T5E_C474295.pdf; ComponentLink2Description: JLCPCB Part URL; ComponentLink2URL: https://jlcpcb.com/partdetail/C474295
pins: 1, 2
1 alternate drawing of the same symbol

## 1210W2J0104T5E
designator R?  Resistance: 100kΩ  (hidden comment: *)
Resistor, 100kΩ, ±5%, 500mW, 200V, ±100ppm/℃, -55℃~+155℃, SMD 1210; Manufacturer: Uniroyal; Manufacturer Part Number: 1210W2J0104T5E; Supplier 1: LCSC; Supplier Part Number 1: C396543; JLCPCB Part Number: C396543; Power Rating: 500mW; Category: Resistors; Package Size: 1210; JLCPCB Basic Part: Yes; Tolerance: ±5%; Voltage Rating: 200V; Temperature Coefficient: ±100ppm/℃; Temperature Rating: -55℃~+155℃; ComponentLink1Description: Datasheet; ComponentLink1URL: https://wmsc.lcsc.com/wmsc/upload/file/pdf/v2/lcsc/2205311945_UNI-ROYAL-Uniroyal-Elec-1210W2J0104T5E_C396543.pdf; ComponentLink2Description: JLCPCB Part URL; ComponentLink2URL: https://jlcpcb.com/partdetail/C396543
pins: 1, 2
1 alternate drawing of the same symbol

## 1210W2J0105T5E
designator R?  Resistance: 1MΩ  (hidden comment: *)
Resistor, 1MΩ, ±5%, 500mW, 200V, ±100ppm/℃, -55℃~+155℃, SMD 1210; Manufacturer: Uniroyal; Manufacturer Part Number: 1210W2J0105T5E; Supplier 1: LCSC; Supplier Part Number 1: C621012; JLCPCB Part Number: C621012; Power Rating: 500mW; Category: Resistors; Package Size: 1210; JLCPCB Basic Part: Yes; Tolerance: ±5%; Voltage Rating: 200V; Temperature Coefficient: ±100ppm/℃; Temperature Rating: -55℃~+155℃; ComponentLink1Description: Datasheet; ComponentLink1URL: https://wmsc.lcsc.com/wmsc/upload/file/pdf/v2/lcsc/2205311830_UNI-ROYAL-Uniroyal-Elec-1210W2J0105T5E_C621012.pdf; ComponentLink2Description: JLCPCB Part URL; ComponentLink2URL: https://jlcpcb.com/partdetail/C621012
pins: 1, 2
1 alternate drawing of the same symbol

## 1210W2J0106T5E
designator R?  Resistance: 10MΩ  (hidden comment: *)
Resistor, 10MΩ, ±5%, 500mW, 200V, ±100ppm/℃, -55℃~+155℃, SMD 1210; Manufacturer: Uniroyal; Manufacturer Part Number: 1210W2J0106T5E; Supplier 1: LCSC; Supplier Part Number 1: C620997; JLCPCB Part Number: C620997; Power Rating: 500mW; Category: Resistors; Package Size: 1210; JLCPCB Basic Part: Yes; Tolerance: ±5%; Voltage Rating: 200V; Temperature Coefficient: ±100ppm/℃; Temperature Rating: -55℃~+155℃; ComponentLink1Description: Datasheet; ComponentLink1URL: https://wmsc.lcsc.com/wmsc/upload/file/pdf/v2/lcsc/2205311830_UNI-ROYAL-Uniroyal-Elec-1210W2J0106T5E_C620997.pdf; ComponentLink2Description: JLCPCB Part URL; ComponentLink2URL: https://jlcpcb.com/partdetail/C620997
pins: 1, 2
1 alternate drawing of the same symbol

## 1210W2J0111T5E
designator R?  Resistance: 110Ω  (hidden comment: *)
Resistor, 110Ω, ±5%, 500mW, 200V, ±100ppm/℃, -55℃~+155℃, SMD 1210; Manufacturer: Uniroyal; Manufacturer Part Number: 1210W2J0111T5E; Supplier 1: LCSC; Supplier Part Number 1: C620998; JLCPCB Part Number: C620998; Power Rating: 500mW; Category: Resistors; Package Size: 1210; JLCPCB Basic Part: Yes; Tolerance: ±5%; Voltage Rating: 200V; Temperature Coefficient: ±100ppm/℃; Temperature Rating: -55℃~+155℃; ComponentLink1Description: Datasheet; ComponentLink1URL: https://wmsc.lcsc.com/wmsc/upload/file/pdf/v2/lcsc/2205311830_UNI-ROYAL-Uniroyal-Elec-1210W2J0111T5E_C620998.pdf; ComponentLink2Description: JLCPCB Part URL; ComponentLink2URL: https://jlcpcb.com/partdetail/C620998
pins: 1, 2
1 alternate drawing of the same symbol

## 1210W2J0112T5E
designator R?  Resistance: 1.1kΩ  (hidden comment: *)
Resistor, 1.1kΩ, ±5%, 500mW, 200V, ±100ppm/℃, -55℃~+155℃, SMD 1210; Manufacturer: Uniroyal; Manufacturer Part Number: 1210W2J0112T5E; Supplier 1: LCSC; Supplier Part Number 1: C620989; JLCPCB Part Number: C620989; Power Rating: 500mW; Category: Resistors; Package Size: 1210; JLCPCB Basic Part: Yes; Tolerance: ±5%; Voltage Rating: 200V; Temperature Coefficient: ±100ppm/℃; Temperature Rating: -55℃~+155℃; ComponentLink1Description: Datasheet; ComponentLink1URL: https://wmsc.lcsc.com/wmsc/upload/file/pdf/v2/lcsc/2205311830_UNI-ROYAL-Uniroyal-Elec-1210W2J0112T5E_C620989.pdf; ComponentLink2Description: JLCPCB Part URL; ComponentLink2URL: https://jlcpcb.com/partdetail/C620989
pins: 1, 2
1 alternate drawing of the same symbol
